# Altium schematic symbol library Regulator_Switching.SchLib: 1120 symbols (part 3 of 8)
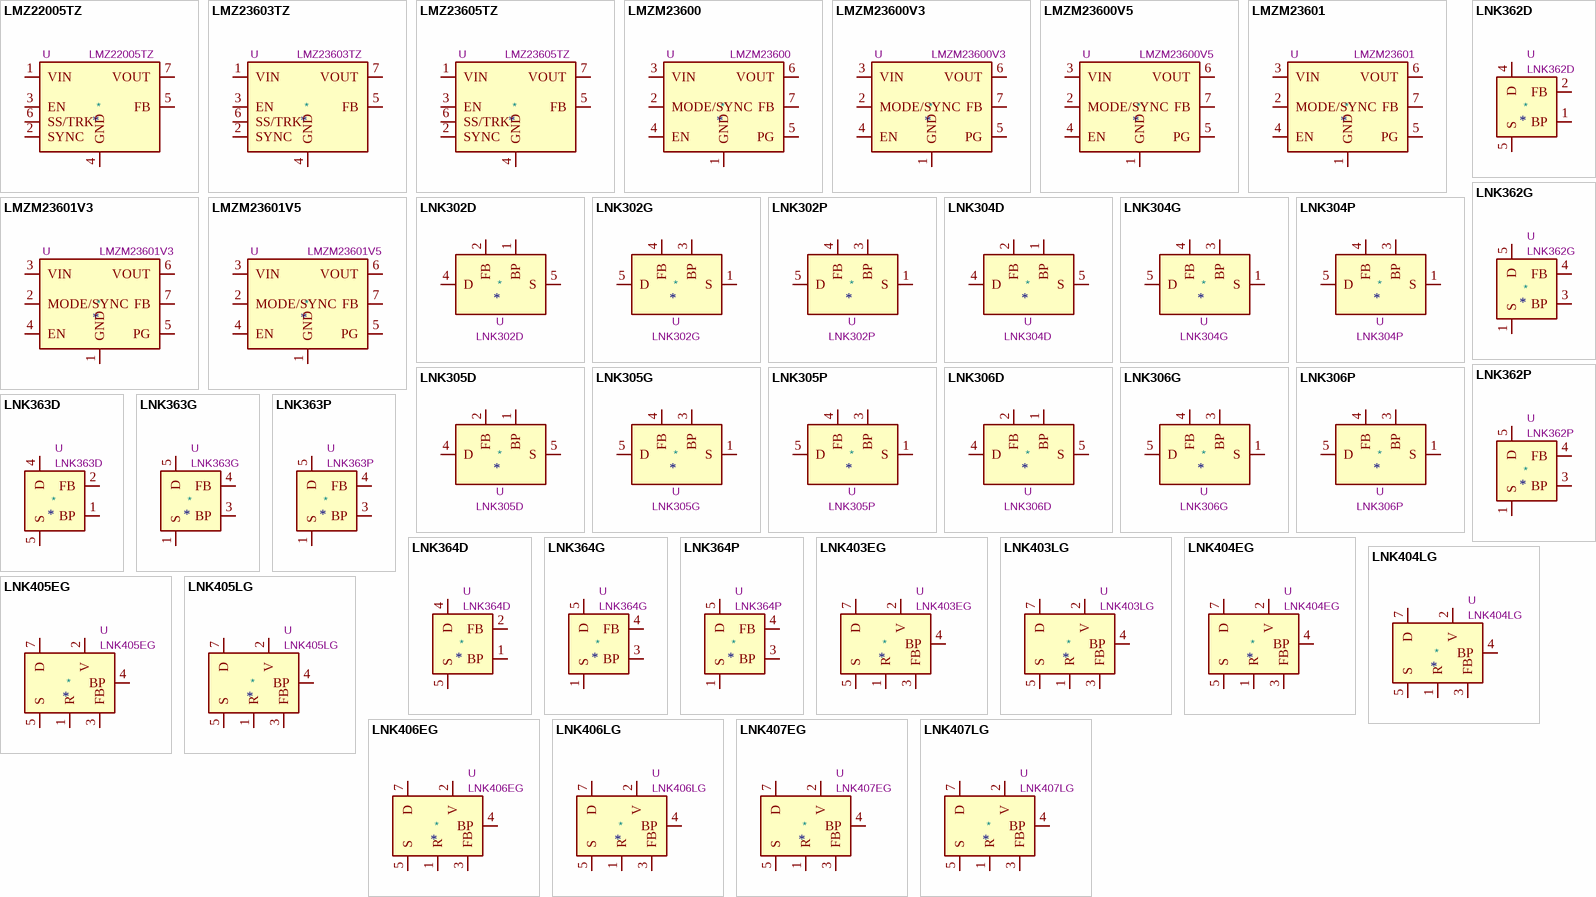
[diagram p29: symbols LMZ22005TZ to LNK407LG]

## LNK305D
designator *  value LNK305D  Reference: U
ki_keywords: Lowest Component Count, Energy-Efficient Off-Line Switcher IC; ki_description: LinkSwitch-TN Family, 280mA Output Current, SO-8C; ki_fp_filters: PowerIntegrations?SO?8B*; Footprint: Package_SO:PowerIntegrations_SO-8B; Datasheet: http://www.powerint.com/sites/default/files/product-docs/lnk302_304-306.pdf
pins: 1 BP, 2 FB, 4 D, 5 S, 6 S hidden, 7 S hidden, 8 S hidden

## LNK305G
designator *  value LNK305G  Reference: U
ki_keywords: Lowest Component Count, Energy-Efficient Off-Line Switcher IC; ki_description: LinkSwitch-TN Family, 280mA Output Current, SMD-8B; ki_fp_filters: PowerIntegrations?SMD?8B*; Footprint: Package_DIP:PowerIntegrations_SMD-8B; Datasheet: http://www.powerint.com/sites/default/files/product-docs/lnk302_304-306.pdf
pins: 1 S, 2 S hidden, 3 BP, 4 FB, 5 D, 7 S hidden, 8 S hidden

## LNK305P
designator *  value LNK305P  Reference: U
ki_keywords: Lowest Component Count, Energy-Efficient Off-Line Switcher IC; ki_description: LinkSwitch-TN Family, 280mA Output Current, DIP-8B; ki_fp_filters: PowerIntegrations?PDIP?8B*; Footprint: Package_DIP:PowerIntegrations_PDIP-8B; Datasheet: http://www.powerint.com/sites/default/files/product-docs/lnk302_304-306.pdf
pins: 1 S, 2 S hidden, 3 BP, 4 FB, 5 D, 7 S hidden, 8 S hidden

## LNK306D
designator *  value LNK306D  Reference: U
ki_keywords: Lowest Component Count, Energy-Efficient Off-Line Switcher IC; ki_description: LinkSwitch-TN Family, 360mA Output Current, SO-8C; ki_fp_filters: PowerIntegrations?SO?8B*; Footprint: Package_SO:PowerIntegrations_SO-8B; Datasheet: http://www.powerint.com/sites/default/files/product-docs/lnk302_304-306.pdf
pins: 1 BP, 2 FB, 4 D, 5 S, 6 S hidden, 7 S hidden, 8 S hidden

## LNK306G
designator *  value LNK306G  Reference: U
ki_keywords: Lowest Component Count, Energy-Efficient Off-Line Switcher IC; ki_description: LinkSwitch-TN Family, 360mA Output Current, SMD-8B; ki_fp_filters: PowerIntegrations?SMD?8B*; Footprint: Package_DIP:PowerIntegrations_SMD-8B; Datasheet: http://www.powerint.com/sites/default/files/product-docs/lnk302_304-306.pdf
pins: 1 S, 2 S hidden, 3 BP, 4 FB, 5 D, 7 S hidden, 8 S hidden

## LNK306P
designator *  value LNK306P  Reference: U
ki_keywords: Lowest Component Count, Energy-Efficient Off-Line Switcher IC; ki_description: LinkSwitch-TN Family, 360mA Output Current, DIP-8B; ki_fp_filters: PowerIntegrations?PDIP?8B*; Footprint: Package_DIP:PowerIntegrations_PDIP-8B; Datasheet: http://www.powerint.com/sites/default/files/product-docs/lnk302_304-306.pdf
pins: 1 S, 2 S hidden, 3 BP, 4 FB, 5 D, 7 S hidden, 8 S hidden

## LNK362D
designator *  value LNK362D  Reference: U
ki_keywords: Energy Effi cient, Low Power Off-Line Switcher IC; ki_description: LinkSwitch-XT Family, 2.6W Output Power, SO-8C; ki_fp_filters: PowerIntegrations?SO?8C*; Footprint: Package_SO:PowerIntegrations_SO-8C; Datasheet: http://www.powerint.com/sites/default/files/product-docs/lnk362-364.pdf
pins: 1 BP, 2 FB, 4 D, 5 S, 6 S hidden, 7 S hidden, 8 S hidden

## LNK362G
designator *  value LNK362G  Reference: U
ki_keywords: Energy Effi cient, Low Power Off-Line Switcher IC; ki_description: LinkSwitch-XT Family, 2.6W Output Power, SMD-8B; ki_fp_filters: PowerIntegrations?SMD?8B*; Footprint: Package_DIP:PowerIntegrations_SMD-8B; Datasheet: http://www.powerint.com/sites/default/files/product-docs/lnk362-364.pdf
pins: 1 S, 2 S hidden, 3 BP, 4 FB, 5 D, 7 S hidden, 8 S hidden

## LNK362P
designator *  value LNK362P  Reference: U
ki_keywords: Energy Effi cient, Low Power Off-Line Switcher IC; ki_description: LinkSwitch-XT Family, 2.6W Output Power, DIP-8B; ki_fp_filters: PowerIntegrations?PDIP?8B*; Footprint: Package_DIP:PowerIntegrations_PDIP-8B; Datasheet: http://www.powerint.com/sites/default/files/product-docs/lnk362-364.pdf
pins: 1 S, 2 S hidden, 3 BP, 4 FB, 5 D, 7 S hidden, 8 S hidden

## LNK363D
designator *  value LNK363D  Reference: U
ki_keywords: Energy Effi cient, Low Power Off-Line Switcher IC; ki_description: LinkSwitch-XT Family, 4.7W Output Power, SO-8C; ki_fp_filters: PowerIntegrations?SO?8C*; Footprint: Package_SO:PowerIntegrations_SO-8C; Datasheet: http://www.powerint.com/sites/default/files/product-docs/lnk362-364.pdf
pins: 1 BP, 2 FB, 4 D, 5 S, 6 S hidden, 7 S hidden, 8 S hidden

## LNK363G
designator *  value LNK363G  Reference: U
ki_keywords: Energy Effi cient, Low Power Off-Line Switcher IC; ki_description: LinkSwitch-XT Family, 4.7W Output Power, SMD-8B; ki_fp_filters: PowerIntegrations?SMD?8B*; Footprint: Package_DIP:PowerIntegrations_SMD-8B; Datasheet: http://www.powerint.com/sites/default/files/product-docs/lnk362-364.pdf
pins: 1 S, 2 S hidden, 3 BP, 4 FB, 5 D, 7 S hidden, 8 S hidden

## LNK363P
designator *  value LNK363P  Reference: U
ki_keywords: Energy Effi cient, Low Power Off-Line Switcher IC; ki_description: LinkSwitch-XT Family, 4.7W Output Power, DIP-8B; ki_fp_filters: PowerIntegrations?PDIP?8B*; Footprint: Package_DIP:PowerIntegrations_PDIP-8B; Datasheet: http://www.powerint.com/sites/default/files/product-docs/lnk362-364.pdf
pins: 1 S, 2 S hidden, 3 BP, 4 FB, 5 D, 7 S hidden, 8 S hidden

## LNK364D
designator *  value LNK364D  Reference: U
ki_keywords: Energy Effi cient, Low Power Off-Line Switcher IC; ki_description: LinkSwitch-XT Family, 6W Output Power, SO-8C; ki_fp_filters: PowerIntegrations?SO?8C*; Footprint: Package_SO:PowerIntegrations_SO-8C; Datasheet: http://www.powerint.com/sites/default/files/product-docs/lnk362-364.pdf
pins: 1 BP, 2 FB, 4 D, 5 S, 6 S hidden, 7 S hidden, 8 S hidden

## LNK364G
designator *  value LNK364G  Reference: U
ki_keywords: Energy Effi cient, Low Power Off-Line Switcher IC; ki_description: LinkSwitch-XT Family, 6W Output Power, SMD-8B; ki_fp_filters: PowerIntegrations?SMD?8B*; Footprint: Package_DIP:PowerIntegrations_SMD-8B; Datasheet: http://www.powerint.com/sites/default/files/product-docs/lnk362-364.pdf
pins: 1 S, 2 S hidden, 3 BP, 4 FB, 5 D, 7 S hidden, 8 S hidden

## LNK364P
designator *  value LNK364P  Reference: U
ki_keywords: Energy Effi cient, Low Power Off-Line Switcher IC; ki_description: LinkSwitch-XT Family, 6W Output Power, DIP-8B; ki_fp_filters: PowerIntegrations?PDIP?8B*; Footprint: Package_DIP:PowerIntegrations_PDIP-8B; Datasheet: http://www.powerint.com/sites/default/files/product-docs/lnk362-364.pdf
pins: 1 S, 2 S hidden, 3 BP, 4 FB, 5 D, 7 S hidden, 8 S hidden

## LNK403EG
designator *  value LNK403EG  Reference: U
ki_keywords: LED Driver IC with TRIAC Dimming, Single-Stage PFC and Primary-Side Constant Current Control; ki_description: LinkSwitch-PH Family, 12W Output Power, eSIP-7C; ki_fp_filters: PowerIntegrations?eSIP?7C*; Footprint: Package_SIP:PowerIntegrations_eSIP-7C; Datasheet: http://www.powerint.com/sites/default/files/product-docs/linkswitch-ph_family_datasheet.pdf
pins: 1 R, 2 V, 3 FB, 4 BP, 5 S, 7 D

## LNK403LG
designator *  value LNK403LG  Reference: U
ki_keywords: LED Driver IC with TRIAC Dimming, Single-Stage PFC and Primary-Side Constant Current Control; ki_description: LinkSwitch-PH Family, 12W Output Power, eSIP-7F; ki_fp_filters: PowerIntegrations?eSIP?7F*; Footprint: Package_SIP:PowerIntegrations_eSIP-7F; Datasheet: http://www.powerint.com/sites/default/files/product-docs/linkswitch-ph_family_datasheet.pdf
pins: 1 R, 2 V, 3 FB, 4 BP, 5 S, 7 D

## LNK404EG
designator *  value LNK404EG  Reference: U
ki_keywords: LED Driver IC with TRIAC Dimming, Single-Stage PFC and Primary-Side Constant Current Control; ki_description: LinkSwitch-PH Family, 15W Output Power, eSIP-7C; ki_fp_filters: PowerIntegrations?eSIP?7C*; Footprint: Package_SIP:PowerIntegrations_eSIP-7C; Datasheet: http://www.powerint.com/sites/default/files/product-docs/linkswitch-ph_family_datasheet.pdf
pins: 1 R, 2 V, 3 FB, 4 BP, 5 S, 7 D

## LNK404LG
designator *  value LNK404LG  Reference: U
ki_keywords: LED Driver IC with TRIAC Dimming, Single-Stage PFC and Primary-Side Constant Current Control; ki_description: LinkSwitch-PH Family, 15W Output Power, eSIP-7F; ki_fp_filters: PowerIntegrations?eSIP?7F*; Footprint: Package_SIP:PowerIntegrations_eSIP-7F; Datasheet: http://www.powerint.com/sites/default/files/product-docs/linkswitch-ph_family_datasheet.pdf
pins: 1 R, 2 V, 3 FB, 4 BP, 5 S, 7 D

## LNK405EG
designator *  value LNK405EG  Reference: U
ki_keywords: LED Driver IC with TRIAC Dimming, Single-Stage PFC and Primary-Side Constant Current Control; ki_description: LinkSwitch-PH Family, 18W Output Power, eSIP-7C; ki_fp_filters: PowerIntegrations?eSIP?7C*; Footprint: Package_SIP:PowerIntegrations_eSIP-7C; Datasheet: http://www.powerint.com/sites/default/files/product-docs/linkswitch-ph_family_datasheet.pdf
pins: 1 R, 2 V, 3 FB, 4 BP, 5 S, 7 D

## LNK405LG
designator *  value LNK405LG  Reference: U
ki_keywords: LED Driver IC with TRIAC Dimming, Single-Stage PFC and Primary-Side Constant Current Control; ki_description: LinkSwitch-PH Family, 18W Output Power, eSIP-7F; ki_fp_filters: PowerIntegrations?eSIP?7F*; Footprint: Package_SIP:PowerIntegrations_eSIP-7F; Datasheet: http://www.powerint.com/sites/default/files/product-docs/linkswitch-ph_family_datasheet.pdf
pins: 1 R, 2 V, 3 FB, 4 BP, 5 S, 7 D

## LNK406EG
designator *  value LNK406EG  Reference: U
ki_keywords: LED Driver IC with TRIAC Dimming, Single-Stage PFC and Primary-Side Constant Current Control; ki_description: LinkSwitch-PH Family, 22W Output Power, eSIP-7C; ki_fp_filters: PowerIntegrations?eSIP?7C*; Footprint: Package_SIP:PowerIntegrations_eSIP-7C; Datasheet: http://www.powerint.com/sites/default/files/product-docs/linkswitch-ph_family_datasheet.pdf
pins: 1 R, 2 V, 3 FB, 4 BP, 5 S, 7 D

## LNK406LG
designator *  value LNK406LG  Reference: U
ki_keywords: LED Driver IC with TRIAC Dimming, Single-Stage PFC and Primary-Side Constant Current Control; ki_description: LinkSwitch-PH Family, 22W Output Power, eSIP-7F; ki_fp_filters: PowerIntegrations?eSIP?7F*; Footprint: Package_SIP:PowerIntegrations_eSIP-7F; Datasheet: http://www.powerint.com/sites/default/files/product-docs/linkswitch-ph_family_datasheet.pdf
pins: 1 R, 2 V, 3 FB, 4 BP, 5 S, 7 D

## LNK407EG
designator *  value LNK407EG  Reference: U
ki_keywords: LED Driver IC with TRIAC Dimming, Single-Stage PFC and Primary-Side Constant Current Control; ki_description: LinkSwitch-PH Family, 25W Output Power, eSIP-7C; ki_fp_filters: PowerIntegrations?eSIP?7C*; Footprint: Package_SIP:PowerIntegrations_eSIP-7C; Datasheet: http://www.powerint.com/sites/default/files/product-docs/linkswitch-ph_family_datasheet.pdf
pins: 1 R, 2 V, 3 FB, 4 BP, 5 S, 7 D

## LNK407LG
designator *  value LNK407LG  Reference: U
ki_keywords: LED Driver IC with TRIAC Dimming, Single-Stage PFC and Primary-Side Constant Current Control; ki_description: LinkSwitch-PH Family, 25W Output Power, eSIP-7F; ki_fp_filters: PowerIntegrations?eSIP?7F*; Footprint: Package_SIP:PowerIntegrations_eSIP-7F; Datasheet: http://www.powerint.com/sites/default/files/product-docs/linkswitch-ph_family_datasheet.pdf
pins: 1 R, 2 V, 3 FB, 4 BP, 5 S, 7 D

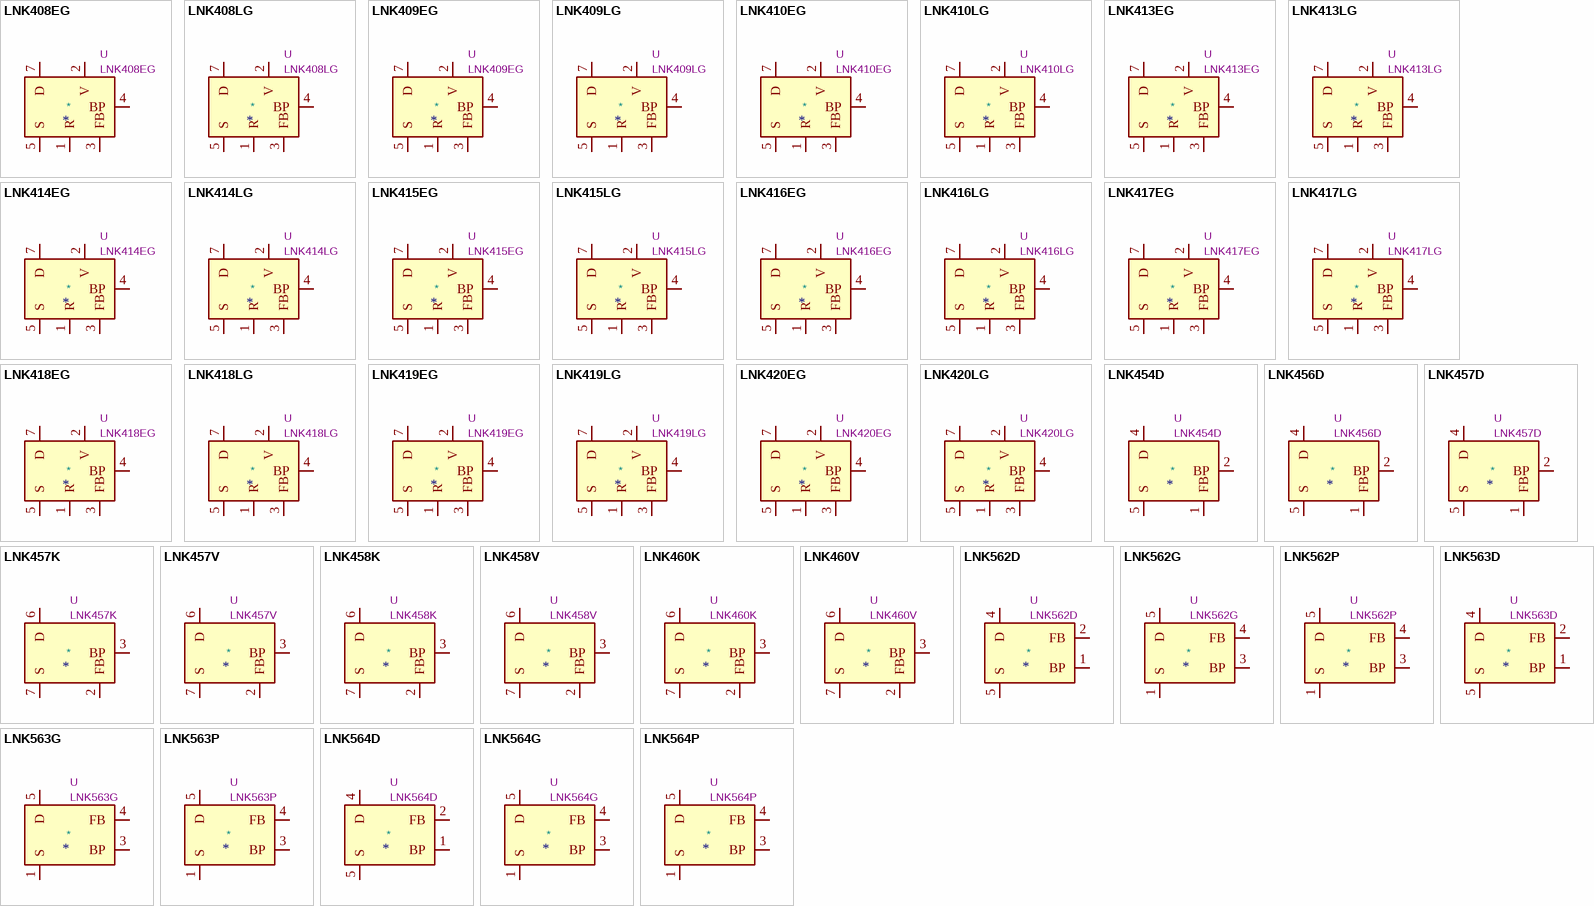
[diagram p9: symbols LNK408EG to LNK564P]

## LNK408EG
designator *  value LNK408EG  Reference: U
ki_keywords: LED Driver IC with TRIAC Dimming, Single-Stage PFC and Primary-Side Constant Current Control; ki_description: LinkSwitch-PH Family, 35W Output Power, eSIP-7C; ki_fp_filters: PowerIntegrations?eSIP?7C*; Footprint: Package_SIP:PowerIntegrations_eSIP-7C; Datasheet: http://www.powerint.com/sites/default/files/product-docs/linkswitch-ph_family_datasheet.pdf
pins: 1 R, 2 V, 3 FB, 4 BP, 5 S, 7 D

## LNK408LG
designator *  value LNK408LG  Reference: U
ki_keywords: LED Driver IC with TRIAC Dimming, Single-Stage PFC and Primary-Side Constant Current Control; ki_description: LinkSwitch-PH Family, 35W Output Power, eSIP-7F; ki_fp_filters: PowerIntegrations?eSIP?7F*; Footprint: Package_SIP:PowerIntegrations_eSIP-7F; Datasheet: http://www.powerint.com/sites/default/files/product-docs/linkswitch-ph_family_datasheet.pdf
pins: 1 R, 2 V, 3 FB, 4 BP, 5 S, 7 D

## LNK409EG
designator *  value LNK409EG  Reference: U
ki_keywords: LED Driver IC with TRIAC Dimming, Single-Stage PFC and Primary-Side Constant Current Control; ki_description: LinkSwitch-PH Family, 50W Output Power, eSIP-7C; ki_fp_filters: PowerIntegrations?eSIP?7C*; Footprint: Package_SIP:PowerIntegrations_eSIP-7C; Datasheet: http://www.powerint.com/sites/default/files/product-docs/linkswitch-ph_family_datasheet.pdf
pins: 1 R, 2 V, 3 FB, 4 BP, 5 S, 7 D

## LNK409LG
designator *  value LNK409LG  Reference: U
ki_keywords: LED Driver IC with TRIAC Dimming, Single-Stage PFC and Primary-Side Constant Current Control; ki_description: LinkSwitch-PH Family, 50W Output Power, eSIP-7F; ki_fp_filters: PowerIntegrations?eSIP?7F*; Footprint: Package_SIP:PowerIntegrations_eSIP-7F; Datasheet: http://www.powerint.com/sites/default/files/product-docs/linkswitch-ph_family_datasheet.pdf
pins: 1 R, 2 V, 3 FB, 4 BP, 5 S, 7 D

## LNK410EG
designator *  value LNK410EG  Reference: U
ki_keywords: LED Driver IC with TRIAC Dimming, Single-Stage PFC and Primary-Side Constant Current Control; ki_description: LinkSwitch-PH Family, 78W Output Power, eSIP-7C; ki_fp_filters: PowerIntegrations?eSIP?7C*; Footprint: Package_SIP:PowerIntegrations_eSIP-7C; Datasheet: http://www.powerint.com/sites/default/files/product-docs/linkswitch-ph_family_datasheet.pdf
pins: 1 R, 2 V, 3 FB, 4 BP, 5 S, 7 D

## LNK410LG
designator *  value LNK410LG  Reference: U
ki_keywords: LED Driver IC with TRIAC Dimming, Single-Stage PFC and Primary-Side Constant Current Control; ki_description: LinkSwitch-PH Family, 78W Output Power, eSIP-7F; ki_fp_filters: PowerIntegrations?eSIP?7F*; Footprint: Package_SIP:PowerIntegrations_eSIP-7F; Datasheet: http://www.powerint.com/sites/default/files/product-docs/linkswitch-ph_family_datasheet.pdf
pins: 1 R, 2 V, 3 FB, 4 BP, 5 S, 7 D

## LNK413EG
designator *  value LNK413EG  Reference: U
ki_keywords: LED Driver IC, Single-Stage PFC and Primary-Side Constant Current Control; ki_description: LinkSwitch-PH Family, 12W Output Power, eSIP-7C; ki_fp_filters: PowerIntegrations?eSIP?7C*; Footprint: Package_SIP:PowerIntegrations_eSIP-7C; Datasheet: http://www.powerint.com/sites/default/files/product-docs/linkswitch-ph_family_datasheet.pdf
pins: 1 R, 2 V, 3 FB, 4 BP, 5 S, 7 D

## LNK413LG
designator *  value LNK413LG  Reference: U
ki_keywords: LED Driver IC, Single-Stage PFC and Primary-Side Constant Current Control; ki_description: LinkSwitch-PH Family, 12W Output Power, eSIP-7F; ki_fp_filters: PowerIntegrations?eSIP?7F*; Footprint: Package_SIP:PowerIntegrations_eSIP-7F; Datasheet: http://www.powerint.com/sites/default/files/product-docs/linkswitch-ph_family_datasheet.pdf
pins: 1 R, 2 V, 3 FB, 4 BP, 5 S, 7 D

## LNK414EG
designator *  value LNK414EG  Reference: U
ki_keywords: LED Driver IC, Single-Stage PFC and Primary-Side Constant Current Control; ki_description: LinkSwitch-PH Family, 15W Output Power, eSIP-7C; ki_fp_filters: PowerIntegrations?eSIP?7C*; Footprint: Package_SIP:PowerIntegrations_eSIP-7C; Datasheet: http://www.powerint.com/sites/default/files/product-docs/linkswitch-ph_family_datasheet.pdf
pins: 1 R, 2 V, 3 FB, 4 BP, 5 S, 7 D

## LNK414LG
designator *  value LNK414LG  Reference: U
ki_keywords: LED Driver IC, Single-Stage PFC and Primary-Side Constant Current Control; ki_description: LinkSwitch-PH Family, 15W Output Power, eSIP-7F; ki_fp_filters: PowerIntegrations?eSIP?7F*; Footprint: Package_SIP:PowerIntegrations_eSIP-7F; Datasheet: http://www.powerint.com/sites/default/files/product-docs/linkswitch-ph_family_datasheet.pdf
pins: 1 R, 2 V, 3 FB, 4 BP, 5 S, 7 D

## LNK415EG
designator *  value LNK415EG  Reference: U
ki_keywords: LED Driver IC, Single-Stage PFC and Primary-Side Constant Current Control; ki_description: LinkSwitch-PH Family, 18W Output Power, eSIP-7C; ki_fp_filters: PowerIntegrations?eSIP?7C*; Footprint: Package_SIP:PowerIntegrations_eSIP-7C; Datasheet: http://www.powerint.com/sites/default/files/product-docs/linkswitch-ph_family_datasheet.pdf
pins: 1 R, 2 V, 3 FB, 4 BP, 5 S, 7 D

## LNK415LG
designator *  value LNK415LG  Reference: U
ki_keywords: LED Driver IC, Single-Stage PFC and Primary-Side Constant Current Control; ki_description: LinkSwitch-PH Family, 18W Output Power, eSIP-7F; ki_fp_filters: PowerIntegrations?eSIP?7F*; Footprint: Package_SIP:PowerIntegrations_eSIP-7F; Datasheet: http://www.powerint.com/sites/default/files/product-docs/linkswitch-ph_family_datasheet.pdf
pins: 1 R, 2 V, 3 FB, 4 BP, 5 S, 7 D

## LNK416EG
designator *  value LNK416EG  Reference: U
ki_keywords: LED Driver IC, Single-Stage PFC and Primary-Side Constant Current Control; ki_description: LinkSwitch-PH Family, 22W Output Power, eSIP-7C; ki_fp_filters: PowerIntegrations?eSIP?7C*; Footprint: Package_SIP:PowerIntegrations_eSIP-7C; Datasheet: http://www.powerint.com/sites/default/files/product-docs/linkswitch-ph_family_datasheet.pdf
pins: 1 R, 2 V, 3 FB, 4 BP, 5 S, 7 D

## LNK416LG
designator *  value LNK416LG  Reference: U
ki_keywords: LED Driver IC, Single-Stage PFC and Primary-Side Constant Current Control; ki_description: LinkSwitch-PH Family, 22W Output Power, eSIP-7F; ki_fp_filters: PowerIntegrations?eSIP?7F*; Footprint: Package_SIP:PowerIntegrations_eSIP-7F; Datasheet: http://www.powerint.com/sites/default/files/product-docs/linkswitch-ph_family_datasheet.pdf
pins: 1 R, 2 V, 3 FB, 4 BP, 5 S, 7 D

## LNK417EG
designator *  value LNK417EG  Reference: U
ki_keywords: LED Driver IC, Single-Stage PFC and Primary-Side Constant Current Control; ki_description: LinkSwitch-PH Family, 25W Output Power, eSIP-7C; ki_fp_filters: PowerIntegrations?eSIP?7C*; Footprint: Package_SIP:PowerIntegrations_eSIP-7C; Datasheet: http://www.powerint.com/sites/default/files/product-docs/linkswitch-ph_family_datasheet.pdf
pins: 1 R, 2 V, 3 FB, 4 BP, 5 S, 7 D

## LNK417LG
designator *  value LNK417LG  Reference: U
ki_keywords: LED Driver IC, Single-Stage PFC and Primary-Side Constant Current Control; ki_description: LinkSwitch-PH Family, 25W Output Power, eSIP-7F; ki_fp_filters: PowerIntegrations?eSIP?7F*; Footprint: Package_SIP:PowerIntegrations_eSIP-7F; Datasheet: http://www.powerint.com/sites/default/files/product-docs/linkswitch-ph_family_datasheet.pdf
pins: 1 R, 2 V, 3 FB, 4 BP, 5 S, 7 D

## LNK418EG
designator *  value LNK418EG  Reference: U
ki_keywords: LED Driver IC, Single-Stage PFC and Primary-Side Constant Current Control; ki_description: LinkSwitch-PH Family, 35W Output Power, eSIP-7C; ki_fp_filters: PowerIntegrations?eSIP?7C*; Footprint: Package_SIP:PowerIntegrations_eSIP-7C; Datasheet: http://www.powerint.com/sites/default/files/product-docs/linkswitch-ph_family_datasheet.pdf
pins: 1 R, 2 V, 3 FB, 4 BP, 5 S, 7 D

## LNK418LG
designator *  value LNK418LG  Reference: U
ki_keywords: LED Driver IC, Single-Stage PFC and Primary-Side Constant Current Control; ki_description: LinkSwitch-PH Family, 35W Output Power, eSIP-7F; ki_fp_filters: PowerIntegrations?eSIP?7F*; Footprint: Package_SIP:PowerIntegrations_eSIP-7F; Datasheet: http://www.powerint.com/sites/default/files/product-docs/linkswitch-ph_family_datasheet.pdf
pins: 1 R, 2 V, 3 FB, 4 BP, 5 S, 7 D

## LNK419EG
designator *  value LNK419EG  Reference: U
ki_keywords: LED Driver IC, Single-Stage PFC and Primary-Side Constant Current Control; ki_description: LinkSwitch-PH Family, 50W Output Power, eSIP-7C; ki_fp_filters: PowerIntegrations?eSIP?7C*; Footprint: Package_SIP:PowerIntegrations_eSIP-7C; Datasheet: http://www.powerint.com/sites/default/files/product-docs/linkswitch-ph_family_datasheet.pdf
pins: 1 R, 2 V, 3 FB, 4 BP, 5 S, 7 D

## LNK419LG
designator *  value LNK419LG  Reference: U
ki_keywords: LED Driver IC, Single-Stage PFC and Primary-Side Constant Current Control; ki_description: LinkSwitch-PH Family, 50W Output Power, eSIP-7F; ki_fp_filters: PowerIntegrations?eSIP?7F*; Footprint: Package_SIP:PowerIntegrations_eSIP-7F; Datasheet: http://www.powerint.com/sites/default/files/product-docs/linkswitch-ph_family_datasheet.pdf
pins: 1 R, 2 V, 3 FB, 4 BP, 5 S, 7 D

## LNK420EG
designator *  value LNK420EG  Reference: U
ki_keywords: LED Driver IC, Single-Stage PFC and Primary-Side Constant Current Control; ki_description: LinkSwitch-PH Family, 78W Output Power, eSIP-7C; ki_fp_filters: PowerIntegrations?eSIP?7C*; Footprint: Package_SIP:PowerIntegrations_eSIP-7C; Datasheet: http://www.powerint.com/sites/default/files/product-docs/linkswitch-ph_family_datasheet.pdf
pins: 1 R, 2 V, 3 FB, 4 BP, 5 S, 7 D

## LNK420LG
designator *  value LNK420LG  Reference: U
ki_keywords: LED Driver IC, Single-Stage PFC and Primary-Side Constant Current Control; ki_description: LinkSwitch-PH Family, 78W Output Power, eSIP-7F; ki_fp_filters: PowerIntegrations?eSIP?7F*; Footprint: Package_SIP:PowerIntegrations_eSIP-7F; Datasheet: http://www.powerint.com/sites/default/files/product-docs/linkswitch-ph_family_datasheet.pdf
pins: 1 R, 2 V, 3 FB, 4 BP, 5 S, 7 D

## LNK454D
designator *  value LNK454D  Reference: U
ki_keywords: LED Driver IC with TRIAC Dimming, Single-Stage PFC and Constant Current Control for Non-Isolated Applications; ki_description: LinkSwitch-PL Family, 3W Output Power, SO-8C; ki_fp_filters: PowerIntegrations?SO?8C*; Footprint: Package_SO:PowerIntegrations_SO-8C; Datasheet: http://www.powerint.com/sites/default/files/product-docs/linkswitch-pl_family_datasheet.pdf
pins: 1 FB, 2 BP, 4 D, 5 S, 6 S hidden, 7 S hidden, 8 S hidden

## LNK456D
designator *  value LNK456D  Reference: U
ki_keywords: LED Driver IC with TRIAC Dimming, Single-Stage PFC and Constant Current Control for Non-Isolated Applications; ki_description: LinkSwitch-PL Family, 6W Output Power, SO-8C; ki_fp_filters: PowerIntegrations?SO?8C*; Footprint: Package_SO:PowerIntegrations_SO-8C; Datasheet: http://www.powerint.com/sites/default/files/product-docs/linkswitch-pl_family_datasheet.pdf
pins: 1 FB, 2 BP, 4 D, 5 S, 6 S hidden, 7 S hidden, 8 S hidden

## LNK457D
designator *  value LNK457D  Reference: U
ki_keywords: LED Driver IC with TRIAC Dimming, Single-Stage PFC and Constant Current Control for Non-Isolated Applications; ki_description: LinkSwitch-PL Family, 8W Output Power, SO-8C; ki_fp_filters: PowerIntegrations?SO?8C*; Footprint: Package_SO:PowerIntegrations_SO-8C; Datasheet: http://www.powerint.com/sites/default/files/product-docs/linkswitch-pl_family_datasheet.pdf
pins: 1 FB, 2 BP, 4 D, 5 S, 6 S hidden, 7 S hidden, 8 S hidden

## LNK457K
designator *  value LNK457K  Reference: U
ki_keywords: LED Driver IC with TRIAC Dimming, Single-Stage PFC and Constant Current Control for Non-Isolated Applications; ki_description: LinkSwitch-PL Family, 8W Output Power, eSOP-12B; ki_fp_filters: PowerIntegrations?eSOP?12B*; Footprint: Package_SO:PowerIntegrations_eSOP-12B; Datasheet: http://www.powerint.com/sites/default/files/product-docs/linkswitch-pl_family_datasheet.pdf
pins: 1 NC hidden, 2 FB, 3 BP, 4 NC hidden, 6 D, 7 S, 8 S hidden, 9 S hidden, 10 S hidden, 11 S hidden, 12 S hidden, 13 S hidden

## LNK457V
designator *  value LNK457V  Reference: U
ki_keywords: LED Driver IC with TRIAC Dimming, Single-Stage PFC and Constant Current Control for Non-Isolated Applications; ki_description: LinkSwitch-PL Family, 8W Output Power, eDIP-12B; ki_fp_filters: PowerIntegrations?eDIP?12B*; Footprint: Package_DIP:PowerIntegrations_eDIP-12B; Datasheet: http://www.powerint.com/sites/default/files/product-docs/linkswitch-pl_family_datasheet.pdf
pins: 1 NC hidden, 2 FB, 3 BP, 4 NC hidden, 6 D, 7 S, 8 S hidden, 9 S hidden, 10 S hidden, 11 S hidden, 12 S hidden

## LNK458K
designator *  value LNK458K  Reference: U
ki_keywords: LED Driver IC with TRIAC Dimming, Single-Stage PFC and Constant Current Control for Non-Isolated Applications; ki_description: LinkSwitch-PL Family, 11.5W Output Power, eSOP-12B; ki_fp_filters: PowerIntegrations?eSOP?12B*; Footprint: Package_SO:PowerIntegrations_eSOP-12B; Datasheet: http://www.powerint.com/sites/default/files/product-docs/linkswitch-pl_family_datasheet.pdf
pins: 1 NC hidden, 2 FB, 3 BP, 4 NC hidden, 6 D, 7 S, 8 S hidden, 9 S hidden, 10 S hidden, 11 S hidden, 12 S hidden, 13 S hidden

## LNK458V
designator *  value LNK458V  Reference: U
ki_keywords: LED Driver IC with TRIAC Dimming, Single-Stage PFC and Constant Current Control for Non-Isolated Applications; ki_description: LinkSwitch-PL Family, 8W Output Power, eDIP-12B; ki_fp_filters: PowerIntegrations?eDIP?12B*; Footprint: Package_DIP:PowerIntegrations_eDIP-12B; Datasheet: http://www.powerint.com/sites/default/files/product-docs/linkswitch-pl_family_datasheet.pdf
pins: 1 NC hidden, 2 FB, 3 BP, 4 NC hidden, 6 D, 7 S, 8 S hidden, 9 S hidden, 10 S hidden, 11 S hidden, 12 S hidden

## LNK460K
designator *  value LNK460K  Reference: U
ki_keywords: LED Driver IC with TRIAC Dimming, Single-Stage PFC and Constant Current Control for Non-Isolated Applications; ki_description: LinkSwitch-PL Family, 16W Output Power, eSOP-12B; ki_fp_filters: PowerIntegrations?eSOP?12B*; Footprint: Package_SO:PowerIntegrations_eSOP-12B; Datasheet: http://www.powerint.com/sites/default/files/product-docs/linkswitch-pl_family_datasheet.pdf
pins: 1 NC hidden, 2 FB, 3 BP, 4 NC hidden, 6 D, 7 S, 8 S hidden, 9 S hidden, 10 S hidden, 11 S hidden, 12 S hidden, 13 S hidden

## LNK460V
designator *  value LNK460V  Reference: U
ki_keywords: LED Driver IC with TRIAC Dimming, Single-Stage PFC and Constant Current Control for Non-Isolated Applications; ki_description: LinkSwitch-PL Family, 8W Output Power, eDIP-12B; ki_fp_filters: PowerIntegrations?eDIP?12B*; Footprint: Package_DIP:PowerIntegrations_eDIP-12B; Datasheet: http://www.powerint.com/sites/default/files/product-docs/linkswitch-pl_family_datasheet.pdf
pins: 1 NC hidden, 2 FB, 3 BP, 4 NC hidden, 6 D, 7 S, 8 S hidden, 9 S hidden, 10 S hidden, 11 S hidden, 12 S hidden

## LNK562D
designator *  value LNK562D  Reference: U
ki_keywords: Energy Efficient Off-Line Switcher IC for Linear Transformer Replacement; ki_description: LinkSwitch-LP Family, 1.9W Output Power, SO-8C; ki_fp_filters: PowerIntegrations?SO?8C*; Footprint: Package_SO:PowerIntegrations_SO-8C; Datasheet: http://www.powerint.com/sites/default/files/product-docs/linklp_family_datasheet.pdf
pins: 1 BP, 2 FB, 4 D, 5 S, 6 S hidden, 7 S hidden, 8 S hidden

## LNK562G
designator *  value LNK562G  Reference: U
ki_keywords: Energy Efficient Off-Line Switcher IC for Linear Transformer Replacement; ki_description: LinkSwitch-LP Family, 1.9W Output Power, SMD-8B; ki_fp_filters: PowerIntegrations?SMD?8B*; Footprint: Package_DIP:PowerIntegrations_SMD-8B; Datasheet: http://www.powerint.com/sites/default/files/product-docs/linklp_family_datasheet.pdf
pins: 1 S, 2 S hidden, 3 BP, 4 FB, 5 D, 7 S hidden, 8 S hidden

## LNK562P
designator *  value LNK562P  Reference: U
ki_keywords: Energy Efficient Off-Line Switcher IC for Linear Transformer Replacement; ki_description: LinkSwitch-LP Family, 1.9W Output Power, DIP-8B; ki_fp_filters: PowerIntegrations?PDIP?8B*; Footprint: Package_DIP:PowerIntegrations_PDIP-8B; Datasheet: http://www.powerint.com/sites/default/files/product-docs/linklp_family_datasheet.pdf
pins: 1 S, 2 S hidden, 3 BP, 4 FB, 5 D, 7 S hidden, 8 S hidden

## LNK563D
designator *  value LNK563D  Reference: U
ki_keywords: Energy Efficient Off-Line Switcher IC for Linear Transformer Replacement; ki_description: LinkSwitch-LP Family, 2.5W Output Power, SO-8C; ki_fp_filters: PowerIntegrations?SO?8C*; Footprint: Package_SO:PowerIntegrations_SO-8C; Datasheet: http://www.powerint.com/sites/default/files/product-docs/linklp_family_datasheet.pdf
pins: 1 BP, 2 FB, 4 D, 5 S, 6 S hidden, 7 S hidden, 8 S hidden

## LNK563G
designator *  value LNK563G  Reference: U
ki_keywords: Energy Efficient Off-Line Switcher IC for Linear Transformer Replacement; ki_description: LinkSwitch-LP Family, 2.5W Output Power, SMD-8B; ki_fp_filters: PowerIntegrations?SMD?8B*; Footprint: Package_DIP:PowerIntegrations_SMD-8B; Datasheet: http://www.powerint.com/sites/default/files/product-docs/linklp_family_datasheet.pdf
pins: 1 S, 2 S hidden, 3 BP, 4 FB, 5 D, 7 S hidden, 8 S hidden

## LNK563P
designator *  value LNK563P  Reference: U
ki_keywords: Energy Efficient Off-Line Switcher IC for Linear Transformer Replacement; ki_description: LinkSwitch-LP Family, 2.5W Output Power, DIP-8B; ki_fp_filters: PowerIntegrations?PDIP?8B*; Footprint: Package_DIP:PowerIntegrations_PDIP-8B; Datasheet: http://www.powerint.com/sites/default/files/product-docs/linklp_family_datasheet.pdf
pins: 1 S, 2 S hidden, 3 BP, 4 FB, 5 D, 7 S hidden, 8 S hidden

## LNK564D
designator *  value LNK564D  Reference: U
ki_keywords: Energy Efficient Off-Line Switcher IC for Linear Transformer Replacement; ki_description: LinkSwitch-LP Family, 3W Output Power, SO-8C; ki_fp_filters: PowerIntegrations?SO?8C*; Footprint: Package_SO:PowerIntegrations_SO-8C; Datasheet: http://www.powerint.com/sites/default/files/product-docs/linklp_family_datasheet.pdf
pins: 1 BP, 2 FB, 4 D, 5 S, 6 S hidden, 7 S hidden, 8 S hidden

## LNK564G
designator *  value LNK564G  Reference: U
ki_keywords: Energy Efficient Off-Line Switcher IC for Linear Transformer Replacement; ki_description: LinkSwitch-LP Family, 3W Output Power, SMD-8B; ki_fp_filters: PowerIntegrations?SMD?8B*; Footprint: Package_DIP:PowerIntegrations_SMD-8B; Datasheet: http://www.powerint.com/sites/default/files/product-docs/linklp_family_datasheet.pdf
pins: 1 S, 2 S hidden, 3 BP, 4 FB, 5 D, 7 S hidden, 8 S hidden

## LNK564P
designator *  value LNK564P  Reference: U
ki_keywords: Energy Efficient Off-Line Switcher IC for Linear Transformer Replacement; ki_description: LinkSwitch-LP Family, 3W Output Power, DIP-8B; ki_fp_filters: PowerIntegrations?PDIP?8B*; Footprint: Package_DIP:PowerIntegrations_PDIP-8B; Datasheet: http://www.powerint.com/sites/default/files/product-docs/linklp_family_datasheet.pdf
pins: 1 S, 2 S hidden, 3 BP, 4 FB, 5 D, 7 S hidden, 8 S hidden

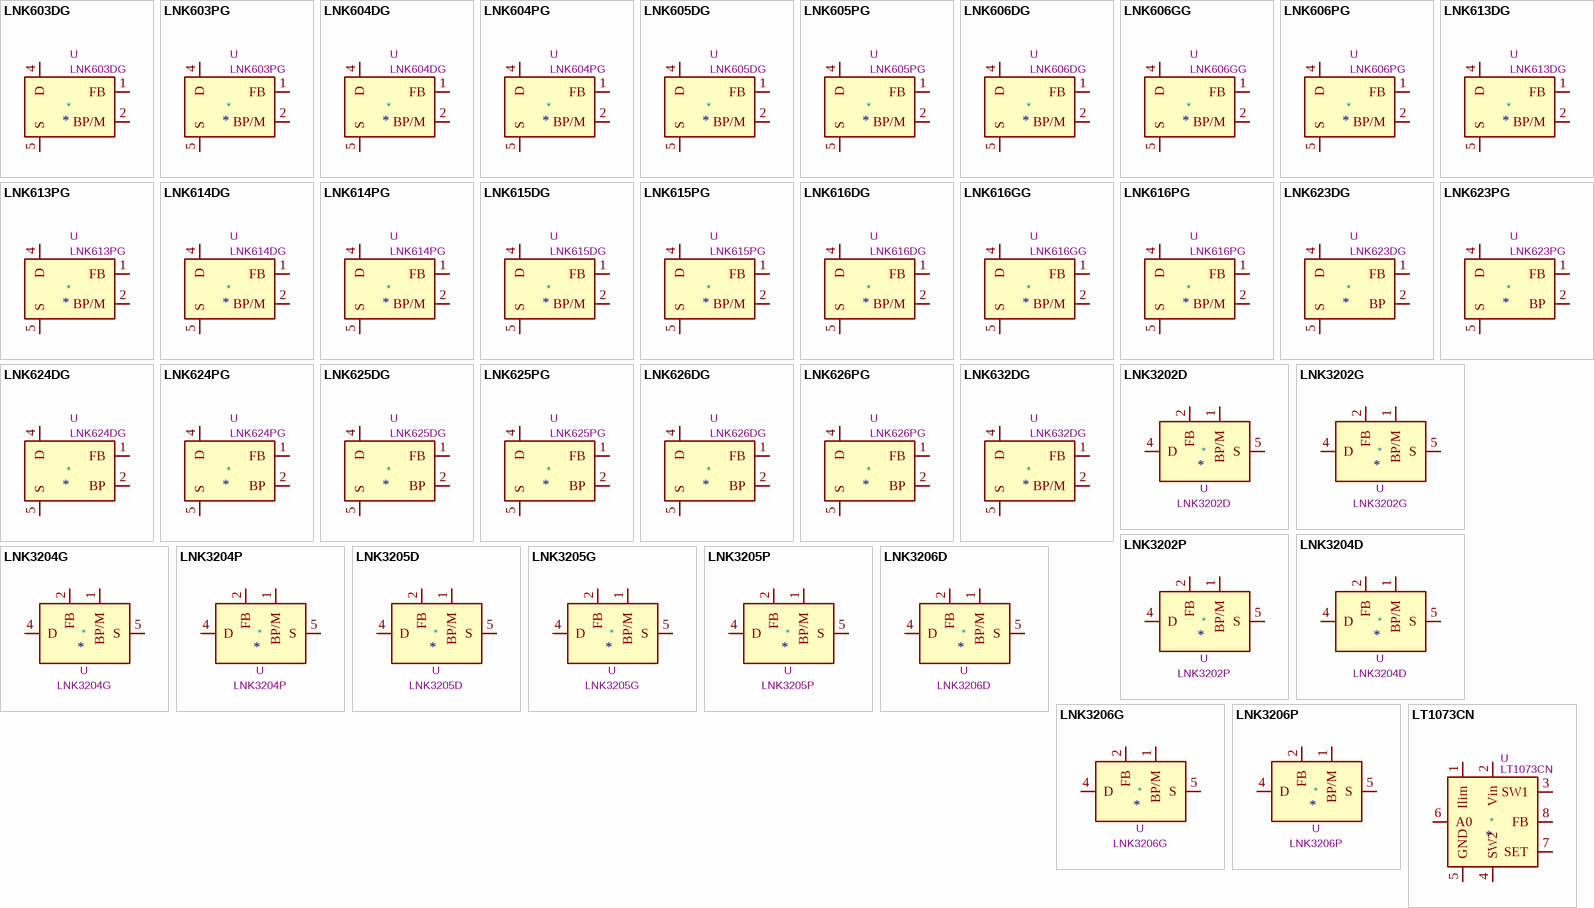
[diagram p10: symbols LNK603DG to LT1073CN]

## LNK603DG
designator *  value LNK603DG  Reference: U
ki_keywords: Energy-Efficient, Accurate CV/CC Switcher for Adapters and Chargers; ki_description: LinkSwitch-II Family, 3.3W Output Power, SO-8C; ki_fp_filters: PowerIntegrations?SO?8C*; Footprint: Package_SO:PowerIntegrations_SO-8C; Datasheet: http://www.powerint.com/sites/default/files/product-docs/linkswitch-ii_family_datasheet.pdf
pins: 1 FB, 2 BP/M, 4 D, 5 S, 6 S hidden, 7 S hidden, 8 S hidden

## LNK603PG
designator *  value LNK603PG  Reference: U
ki_keywords: Energy-Efficient, Accurate CV/CC Switcher for Adapters and Chargers; ki_description: LinkSwitch-II Family, 3.3W Output Power, DIP-8C; ki_fp_filters: PowerIntegrations?PDIP?8C*; Footprint: Package_DIP:PowerIntegrations_PDIP-8C; Datasheet: http://www.powerint.com/sites/default/files/product-docs/linkswitch-ii_family_datasheet.pdf
pins: 1 FB, 2 BP/M, 4 D, 5 S, 6 S hidden, 7 S hidden, 8 S hidden

## LNK604DG
designator *  value LNK604DG  Reference: U
ki_keywords: Energy-Efficient, Accurate CV/CC Switcher for Adapters and Chargers; ki_description: LinkSwitch-II Family, 4.1W Output Power, SO-8C; ki_fp_filters: PowerIntegrations?SO?8C*; Footprint: Package_SO:PowerIntegrations_SO-8C; Datasheet: http://www.powerint.com/sites/default/files/product-docs/linkswitch-ii_family_datasheet.pdf
pins: 1 FB, 2 BP/M, 4 D, 5 S, 6 S hidden, 7 S hidden, 8 S hidden

## LNK604PG
designator *  value LNK604PG  Reference: U
ki_keywords: Energy-Efficient, Accurate CV/CC Switcher for Adapters and Chargers; ki_description: LinkSwitch-II Family, 4.1W Output Power, DIP-8C; ki_fp_filters: PowerIntegrations?PDIP?8C*; Footprint: Package_DIP:PowerIntegrations_PDIP-8C; Datasheet: http://www.powerint.com/sites/default/files/product-docs/linkswitch-ii_family_datasheet.pdf
pins: 1 FB, 2 BP/M, 4 D, 5 S, 6 S hidden, 7 S hidden, 8 S hidden

## LNK605DG
designator *  value LNK605DG  Reference: U
ki_keywords: Energy-Efficient, Accurate CV/CC Switcher for Adapters and Chargers; ki_description: LinkSwitch-II Family, 5.1W Output Power, SO-8C; ki_fp_filters: PowerIntegrations?SO?8C*; Footprint: Package_SO:PowerIntegrations_SO-8C; Datasheet: http://www.powerint.com/sites/default/files/product-docs/linkswitch-ii_family_datasheet.pdf
pins: 1 FB, 2 BP/M, 4 D, 5 S, 6 S hidden, 7 S hidden, 8 S hidden

## LNK605PG
designator *  value LNK605PG  Reference: U
ki_keywords: Energy-Efficient, Accurate CV/CC Switcher for Adapters and Chargers; ki_description: LinkSwitch-II Family, 5.1W Output Power, DIP-8C; ki_fp_filters: PowerIntegrations?PDIP?8C*; Footprint: Package_DIP:PowerIntegrations_PDIP-8C; Datasheet: http://www.powerint.com/sites/default/files/product-docs/linkswitch-ii_family_datasheet.pdf
pins: 1 FB, 2 BP/M, 4 D, 5 S, 6 S hidden, 7 S hidden, 8 S hidden

## LNK606DG
designator *  value LNK606DG  Reference: U
ki_keywords: Energy-Efficient, Accurate CV/CC Switcher for Adapters and Chargers; ki_description: LinkSwitch-II Family, 6.1W Output Power, SO-8C; ki_fp_filters: PowerIntegrations?SO?8C*; Footprint: Package_SO:PowerIntegrations_SO-8C; Datasheet: http://www.powerint.com/sites/default/files/product-docs/linkswitch-ii_family_datasheet.pdf
pins: 1 FB, 2 BP/M, 4 D, 5 S, 6 S hidden, 7 S hidden, 8 S hidden

## LNK606GG
designator *  value LNK606GG  Reference: U
ki_keywords: Energy-Efficient, Accurate CV/CC Switcher for Adapters and Chargers; ki_description: LinkSwitch-II Family, 6.1W Output Power, SMD-8C; ki_fp_filters: PowerIntegrations?SMD?8C*; Footprint: Package_DIP:PowerIntegrations_SMD-8C; Datasheet: http://www.powerint.com/sites/default/files/product-docs/linkswitch-ii_family_datasheet.pdf
pins: 1 FB, 2 BP/M, 4 D, 5 S, 6 S hidden, 7 S hidden, 8 S hidden

## LNK606PG
designator *  value LNK606PG  Reference: U
ki_keywords: Energy-Efficient, Accurate CV/CC Switcher for Adapters and Chargers; ki_description: LinkSwitch-II Family, 6.1W Output Power, DIP-8C; ki_fp_filters: PowerIntegrations?PDIP?8C*; Footprint: Package_DIP:PowerIntegrations_PDIP-8C; Datasheet: http://www.powerint.com/sites/default/files/product-docs/linkswitch-ii_family_datasheet.pdf
pins: 1 FB, 2 BP/M, 4 D, 5 S, 6 S hidden, 7 S hidden, 8 S hidden

## LNK613DG
designator *  value LNK613DG  Reference: U
ki_keywords: Energy-Efficient, Accurate CV/CC Switcher for Adapters and Chargers; ki_description: LinkSwitch-II Family, 3.3W Output Power, SO-8C; ki_fp_filters: PowerIntegrations?SO?8C*; Footprint: Package_SO:PowerIntegrations_SO-8C; Datasheet: http://www.powerint.com/sites/default/files/product-docs/linkswitch-ii_family_datasheet.pdf
pins: 1 FB, 2 BP/M, 4 D, 5 S, 6 S hidden, 7 S hidden, 8 S hidden

## LNK613PG
designator *  value LNK613PG  Reference: U
ki_keywords: Energy-Efficient, Accurate CV/CC Switcher for Adapters and Chargers; ki_description: LinkSwitch-II Family, 3.3W Output Power, DIP-8C; ki_fp_filters: PowerIntegrations?PDIP?8C*; Footprint: Package_DIP:PowerIntegrations_PDIP-8C; Datasheet: http://www.powerint.com/sites/default/files/product-docs/linkswitch-ii_family_datasheet.pdf
pins: 1 FB, 2 BP/M, 4 D, 5 S, 6 S hidden, 7 S hidden, 8 S hidden

## LNK614DG
designator *  value LNK614DG  Reference: U
ki_keywords: Energy-Efficient, Accurate CV/CC Switcher for Adapters and Chargers; ki_description: LinkSwitch-II Family, 4.1W Output Power, SO-8C; ki_fp_filters: PowerIntegrations?SO?8C*; Footprint: Package_SO:PowerIntegrations_SO-8C; Datasheet: http://www.powerint.com/sites/default/files/product-docs/linkswitch-ii_family_datasheet.pdf
pins: 1 FB, 2 BP/M, 4 D, 5 S, 6 S hidden, 7 S hidden, 8 S hidden

## LNK614PG
designator *  value LNK614PG  Reference: U
ki_keywords: Energy-Efficient, Accurate CV/CC Switcher for Adapters and Chargers; ki_description: LinkSwitch-II Family, 4.1W Output Power, DIP-8C; ki_fp_filters: PowerIntegrations?PDIP?8C*; Footprint: Package_DIP:PowerIntegrations_PDIP-8C; Datasheet: http://www.powerint.com/sites/default/files/product-docs/linkswitch-ii_family_datasheet.pdf
pins: 1 FB, 2 BP/M, 4 D, 5 S, 6 S hidden, 7 S hidden, 8 S hidden

## LNK615DG
designator *  value LNK615DG  Reference: U
ki_keywords: Energy-Efficient, Accurate CV/CC Switcher for Adapters and Chargers; ki_description: LinkSwitch-II Family, 5.1W Output Power, SO-8C; ki_fp_filters: PowerIntegrations?SO?8C*; Footprint: Package_SO:PowerIntegrations_SO-8C; Datasheet: http://www.powerint.com/sites/default/files/product-docs/linkswitch-ii_family_datasheet.pdf
pins: 1 FB, 2 BP/M, 4 D, 5 S, 6 S hidden, 7 S hidden, 8 S hidden

## LNK615PG
designator *  value LNK615PG  Reference: U
ki_keywords: Energy-Efficient, Accurate CV/CC Switcher for Adapters and Chargers; ki_description: LinkSwitch-II Family, 5.1W Output Power, DIP-8C; ki_fp_filters: PowerIntegrations?PDIP?8C*; Footprint: Package_DIP:PowerIntegrations_PDIP-8C; Datasheet: http://www.powerint.com/sites/default/files/product-docs/linkswitch-ii_family_datasheet.pdf
pins: 1 FB, 2 BP/M, 4 D, 5 S, 6 S hidden, 7 S hidden, 8 S hidden